# Altium schematic symbol library LATTICEPLDS_Library.SchLib: 291 symbols (part 19 of 32)
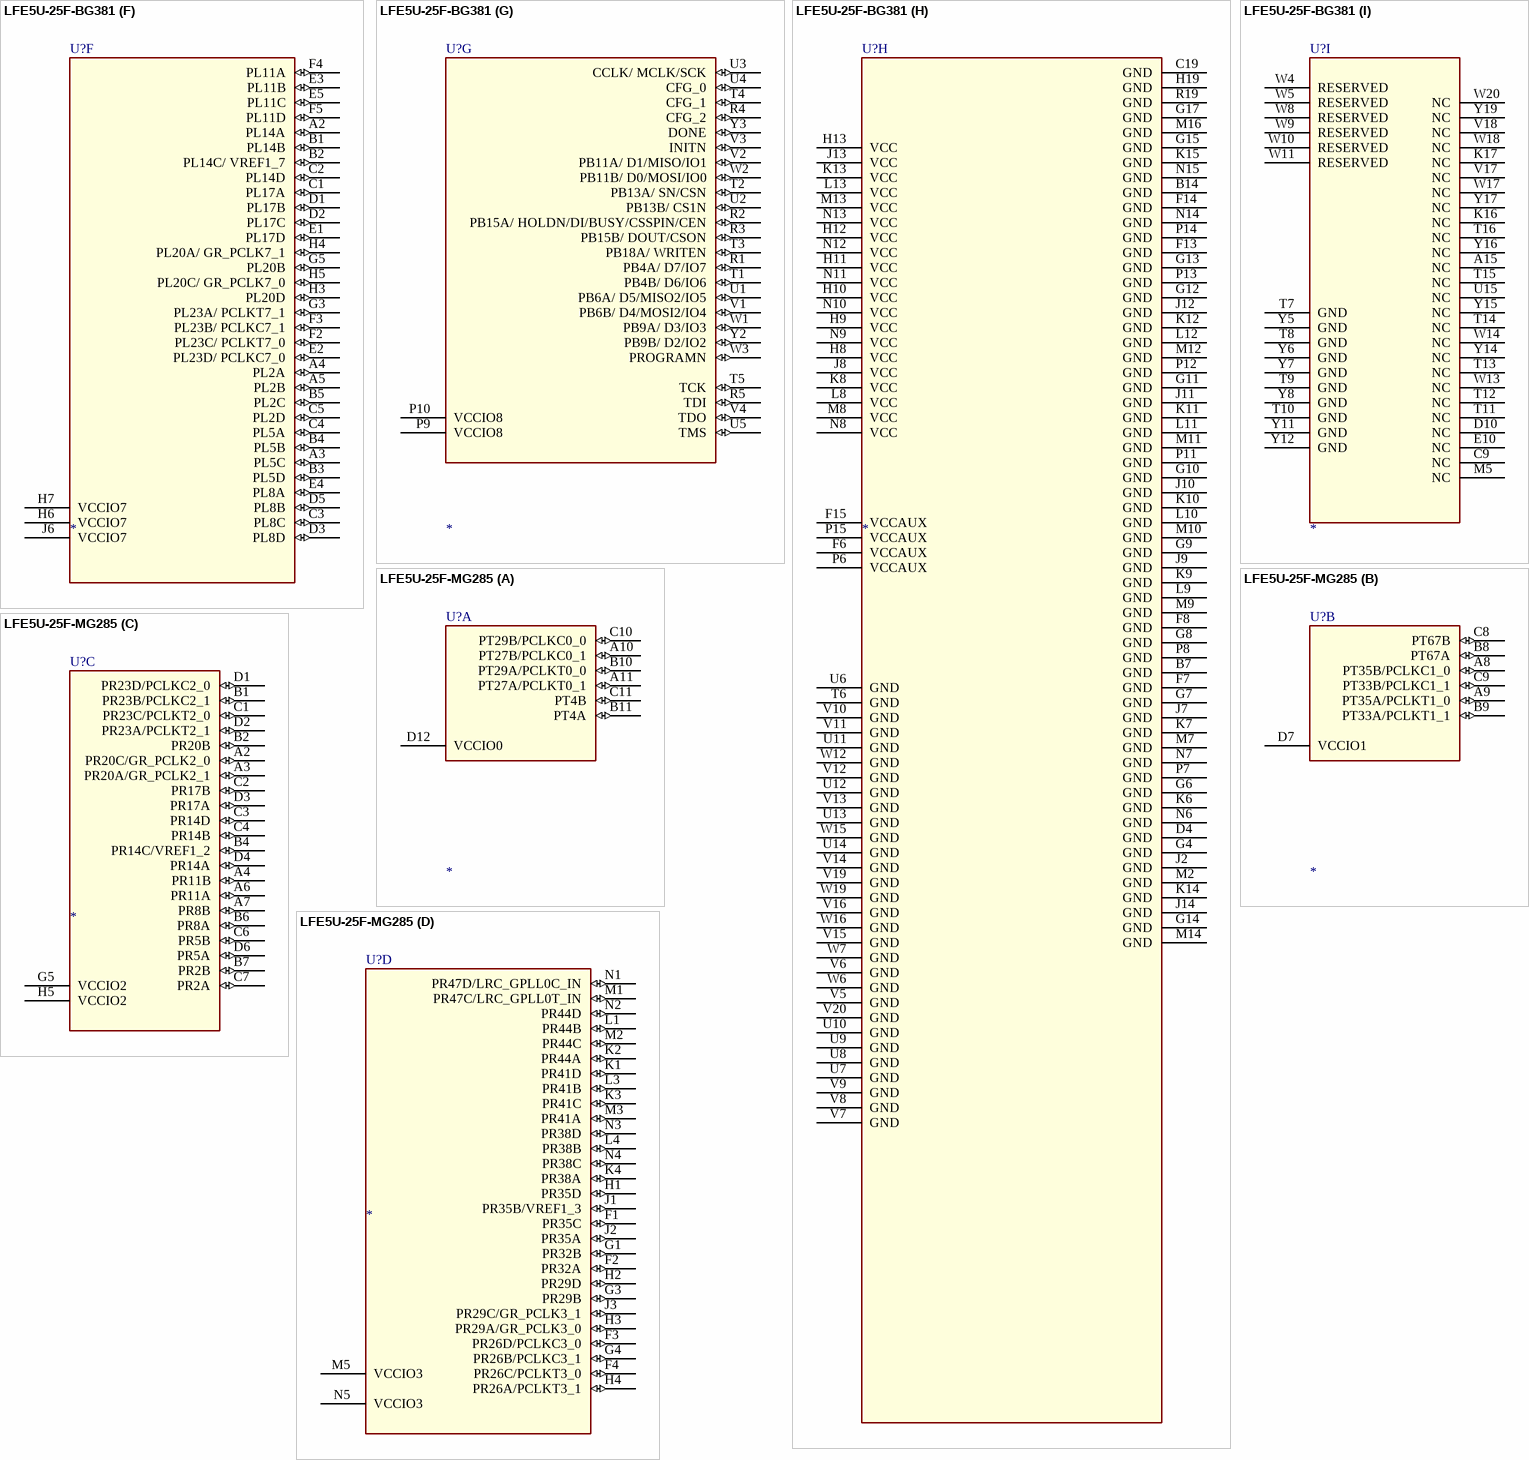
[diagram p321: symbols LFE5U-25F-BG381 to LFE5U-25F-MG285]

## LFE5U-25F-BG381
designator U?
SWAP_INFO: (S1+S2+S3+S4+S5+S6+S7+S8+S9); SPLIT_INST: TRUE
part A pins: A6 PT4A (io), A7 PT18A (io), A8 PT18B (io), A9 PT24A/ GR_PCLK0_1 (io), A10 PT27A/ PCLKT0_1 (io), A11 PT27B/ PCLKC0_1 (io), B6 PT4B (io), B8 PT15B (io), B9 PT22A (io), B10 PT24B/ GR_PCLK0_0 (io), B11 PT29A/ PCLKT0_0 (io), C6 PT11A (io), C7 PT11B (io), C8 PT15A (io), C10 PT22B (io), C11 PT29B/ PCLKC0_0 (io), D6 PT6B (io), D7 PT9B (io), D8 PT13B (io), D9 PT20A (io), E6 PT6A (io), E7 PT9A (io), E8 PT13A (io), E9 PT20B (io), F9 VCCIO0 (power), F10 VCCIO0 (power)
part B pins: A12 PT40A (io), A13 PT40B (io), A14 PT47A (io), A16 PT56A (io), A17 PT62A (io), A18 PT65A (io), A19 PT67A (io), B12 PT35A/ PCLKT1_0 (io), B13 PT42A (io), B15 PT51A (io), B16 PT56B (io), B17 PT60A (io), B18 PT62B (io), B19 PT65B (io), B20 PT67B (io), C12 PT35B/ PCLKC1_0 (io), C13 PT42B (io), C14 PT47B (io), C15 PT51B (io), C16 PT58A (io), C17 PT60B (io), D11 PT33A/ PCLKT1_1 (io), D12 PT38A/ GR_PCLK1_0 (io), D13 PT44A (io), D14 PT49A (io), D15 PT53A (io), D16 PT58B (io), E11 PT33B/ PCLKC1_1 (io), E12 PT38B/ GR_PCLK1_1 (io), E13 PT44B (io), E14 PT49B (io), E15 PT53B (io), F11 VCCIO1 (power), F12 VCCIO1 (power)
part C pins: C18 PR2A (io), C20 PR14A (io), D17 PR2B (io), D18 PR5A (io), D19 PR14B (io), D20 PR14C/ VREF1_2 (io), E16 PR2C (io), E17 PR5B (io), E18 PR5C (io), E19 PR14D (io), E20 PR17A (io), F16 PR2D (io), F17 PR8A (io), F18 PR5D (io), F19 PR17B (io), F20 PR17C (io), G16 PR8C (io), G18 PR8B (io), G19 PR20A/ GR_PCLK2_1 (io), G20 PR17D (io), H14 VCCIO2 (power), H15 VCCIO2 (power), H16 PR8D (io), H17 PR11B (io), H18 PR11A (io), H20 PR20B (io), J15 VCCIO2 (power), J16 PR11D (io), J17 PR11C (io), J18 PR20C/ GR_PCLK2_0 (io), J19 PR23A/ PCLKT2_1 (io), J20 PR23C/ PCLKT2_0 (io), K18 PR20D (io), K19 PR23B/ PCLKC2_1 (io), K20 PR23D/ PCLKC2_0 (io)
part D pins: L14 VCCIO3 (power), L15 VCCIO3 (power), L16 PR29A/ GR_PCLK3_0 (io), L17 PR29B (io), L18 PR29C/ GR_PCLK3_1 (io), L19 PR26C/ PCLKT3_0 (io), L20 PR26A/ PCLKT3_1 (io), M15 VCCIO3 (power), M17 PR32B (io), M18 PR29D (io), M19 PR26D/ PCLKC3_0 (io), M20 PR26B/ PCLKC3_1 (io), N16 PR32A (io), N17 PR35A (io), N18 PR32C (io), N19 PR38A (io), N20 PR38B (io), P16 PR35B/ VREF1_3 (io), P17 PR32D (io), P18 PR38D (io), P19 PR38C (io), P20 PR41A (io), R16 PR35C (io), R17 PR35D (io), R18 PR44B (io), R20 PR41B (io), T17 PR47D/ LRC_GPLL0C_IN (io), T18 PR44D (io), T19 PR44A (io), T20 PR41C (io), U16 PR47C/ LRC_GPLL0T_IN (io), U17 PR47B (io), U18 PR47A (io), U19 PR44C (io), U20 PR41D (io)
part E pins: F1 PL26B/ PCLKC6_1 (io), G1 PL26D/ PCLKC6_0 (io), G2 PL26A/ PCLKT6_1 (io), H1 PL32C (io), H2 PL26C/ PCLKT6_0 (io), J1 PL32B (io), J3 PL29C/ GR_PCLK6_1 (io), J4 PL29A/ GR_PCLK6_0 (io), J5 PL29B (io), K1 PL32D (io), K2 PL32A (io), K3 PL29D (io), K4 PL35A (io), K5 PL35B/ VREF1_6 (io), L1 PL44C (io), L2 PL41D (io), L3 PL41C (io), L4 PL35C (io), L5 PL35D (io), L6 VCCIO6 (power), L7 VCCIO6 (power), M1 PL44B (io), M3 PL41B (io), M4 PL38A (io), M6 VCCIO6 (power), N1 PL44D (io), N2 PL44A (io), N3 PL41A (io), N4 PL38C (io), N5 PL38B (io), P1 PL47A (io), P2 PL47B (io), P3 PL47C/ LLC_GPLL0T_IN (io), P4 PL47D/ LLC_GPLL0C_IN (io), P5 PL38D (io)
part F pins: A2 PL14A (io), A3 PL5C (io), A4 PL2A (io), A5 PL2B (io), B1 PL14B (io), B2 PL14C/ VREF1_7 (io), B3 PL5D (io), B4 PL5B (io), B5 PL2C (io), C1 PL17A (io), C2 PL14D (io), C3 PL8C (io), C4 PL5A (io), C5 PL2D (io), D1 PL17B (io), D2 PL17C (io), D3 PL8D (io), D5 PL8B (io), E1 PL17D (io), E2 PL23D/ PCLKC7_0 (io), E3 PL11B (io), E4 PL8A (io), E5 PL11C (io), F2 PL23C/ PCLKT7_0 (io), F3 PL23B/ PCLKC7_1 (io), F4 PL11A (io), F5 PL11D (io), G3 PL23A/ PCLKT7_1 (io), G5 PL20B (io), H3 PL20D (io), H4 PL20A/ GR_PCLK7_1 (io), H5 PL20C/ GR_PCLK7_0 (io), H6 VCCIO7 (power), H7 VCCIO7 (power), J6 VCCIO7 (power)
part G pins: P9 VCCIO8 (power), P10 VCCIO8 (power), R1 PB4A/ D7/IO7 (io), R2 PB15A/ HOLDN/DI/BUSY/CSSPIN/CEN (io), R3 PB15B/ DOUT/CSON (io), R4 CFG_2 (io), R5 TDI (io), T1 PB4B/ D6/IO6 (io), T2 PB13A/ SN/CSN (io), T3 PB18A/ WRITEN (io), T4 CFG_1 (io), T5 TCK (io), U1 PB6A/ D5/MISO2/IO5 (io), U2 PB13B/ CS1N (io), U3 CCLK/ MCLK/SCK (io), U4 CFG_0 (io), U5 TMS (io), V1 PB6B/ D4/MOSI2/IO4 (io), V2 PB11A/ D1/MISO/IO1 (io), V3 INITN (io), V4 TDO (io), W1 PB9A/ D3/IO3 (io), W2 PB11B/ D0/MOSI/IO0 (io), W3 PROGRAMN (io), Y2 PB9B/ D2/IO2 (io), Y3 DONE (io)
part H pins: B7 GND (power), B14 GND (power), C19 GND (power), D4 GND (power), F6 VCCAUX (power), F7 GND (power), F8 GND (power), F13 GND (power), F14 GND (power), F15 VCCAUX (power), G4 GND (power), G6 GND (power), G7 GND (power), G8 GND (power), G9 GND (power), G10 GND (power), G11 GND (power), G12 GND (power), G13 GND (power), G14 GND (power), G15 GND (power), G17 GND (power), H8 VCC (power), H9 VCC (power), H10 VCC (power), H11 VCC (power), H12 VCC (power), H13 VCC (power), H19 GND (power), J2 GND (power), J7 GND (power), J8 VCC (power), J9 GND (power), J10 GND (power), J11 GND (power), J12 GND (power), J13 VCC (power), J14 GND (power), K6 GND (power), K7 GND (power), K8 VCC (power), K9 GND (power), K10 GND (power), K11 GND (power), K12 GND (power), K13 VCC (power), K14 GND (power), K15 GND (power), L8 VCC (power), L9 GND (power), L10 GND (power), L11 GND (power), L12 GND (power), L13 VCC (power), M2 GND (power), M7 GND (power), M8 VCC (power), M9 GND (power), M10 GND (power), M11 GND (power), M12 GND (power), M13 VCC (power), M14 GND (power), M16 GND (power), N6 GND (power), N7 GND (power), N8 VCC (power), N9 VCC (power), N10 VCC (power), N11 VCC (power), N12 VCC (power), N13 VCC (power), N14 GND (power), N15 GND (power), P6 VCCAUX (power), P7 GND (power), P8 GND (power), P11 GND (power), P12 GND (power), P13 GND (power), P14 GND (power), P15 VCCAUX (power), R19 GND (power), T6 GND (power), U6 GND (power), U7 GND (power), U8 GND (power), U9 GND (power), U10 GND (power), U11 GND (power), U12 GND (power), U13 GND (power), U14 GND (power), V5 GND (power), V6 GND (power), V7 GND (power), V8 GND (power), V9 GND (power), V10 GND (power), V11 GND (power), V12 GND (power), V13 GND (power), V14 GND (power), V15 GND (power), V16 GND (power), V19 GND (power), V20 GND (power), W6 GND (power), W7 GND (power), W12 GND (power), W15 GND (power), W16 GND (power), W19 GND (power)
part I pins: A15 NC (power), C9 NC (power), D10 NC (power), E10 NC (power), K16 NC (power), K17 NC (power), M5 NC (power), T7 GND (power), T8 GND (power), T9 GND (power), T10 GND (power), T11 NC (power), T12 NC (power), T13 NC (power), T14 NC (power), T15 NC (power), T16 NC (power), U15 NC (power), V17 NC (power), V18 NC (power), W4 RESERVED (power), W5 RESERVED (power), W8 RESERVED (power), W9 RESERVED (power), W10 RESERVED (power), W11 RESERVED (power), W13 NC (power), W14 NC (power), W17 NC (power), W18 NC (power), W20 NC (power), Y5 GND (power), Y6 GND (power), Y7 GND (power), Y8 GND (power), Y11 GND (power), Y12 GND (power), Y14 NC (power), Y15 NC (power), Y16 NC (power), Y17 NC (power), Y19 NC (power)

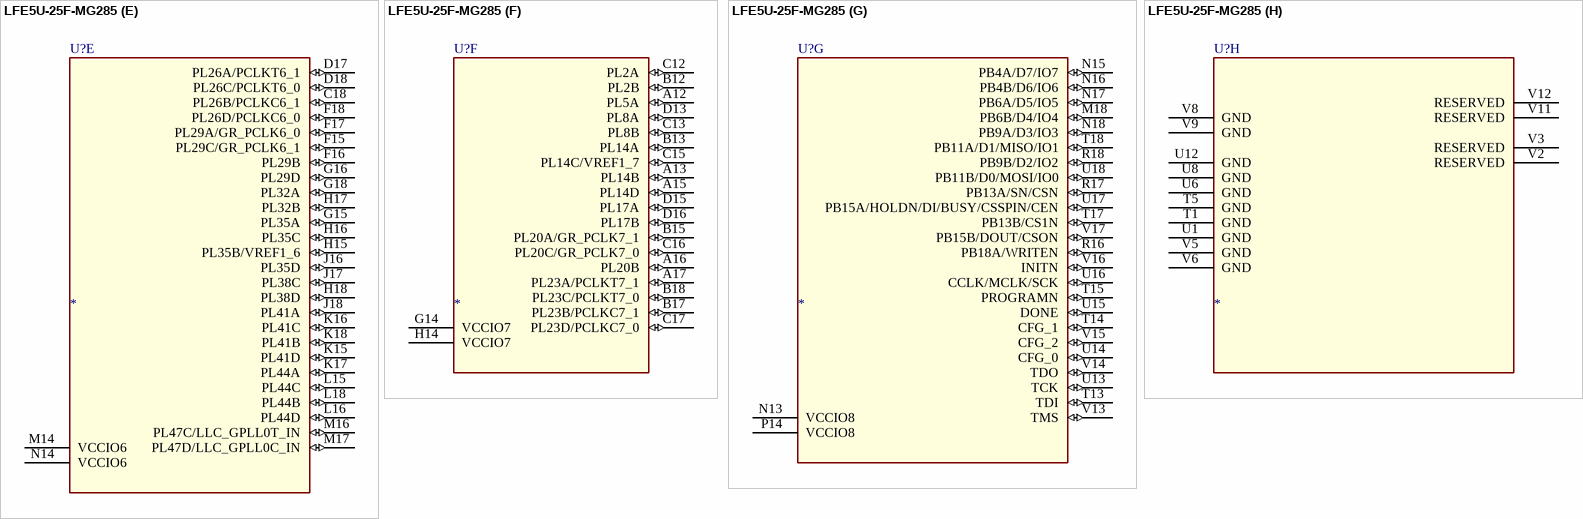
[diagram p175: symbol LFE5U-25F-MG285]

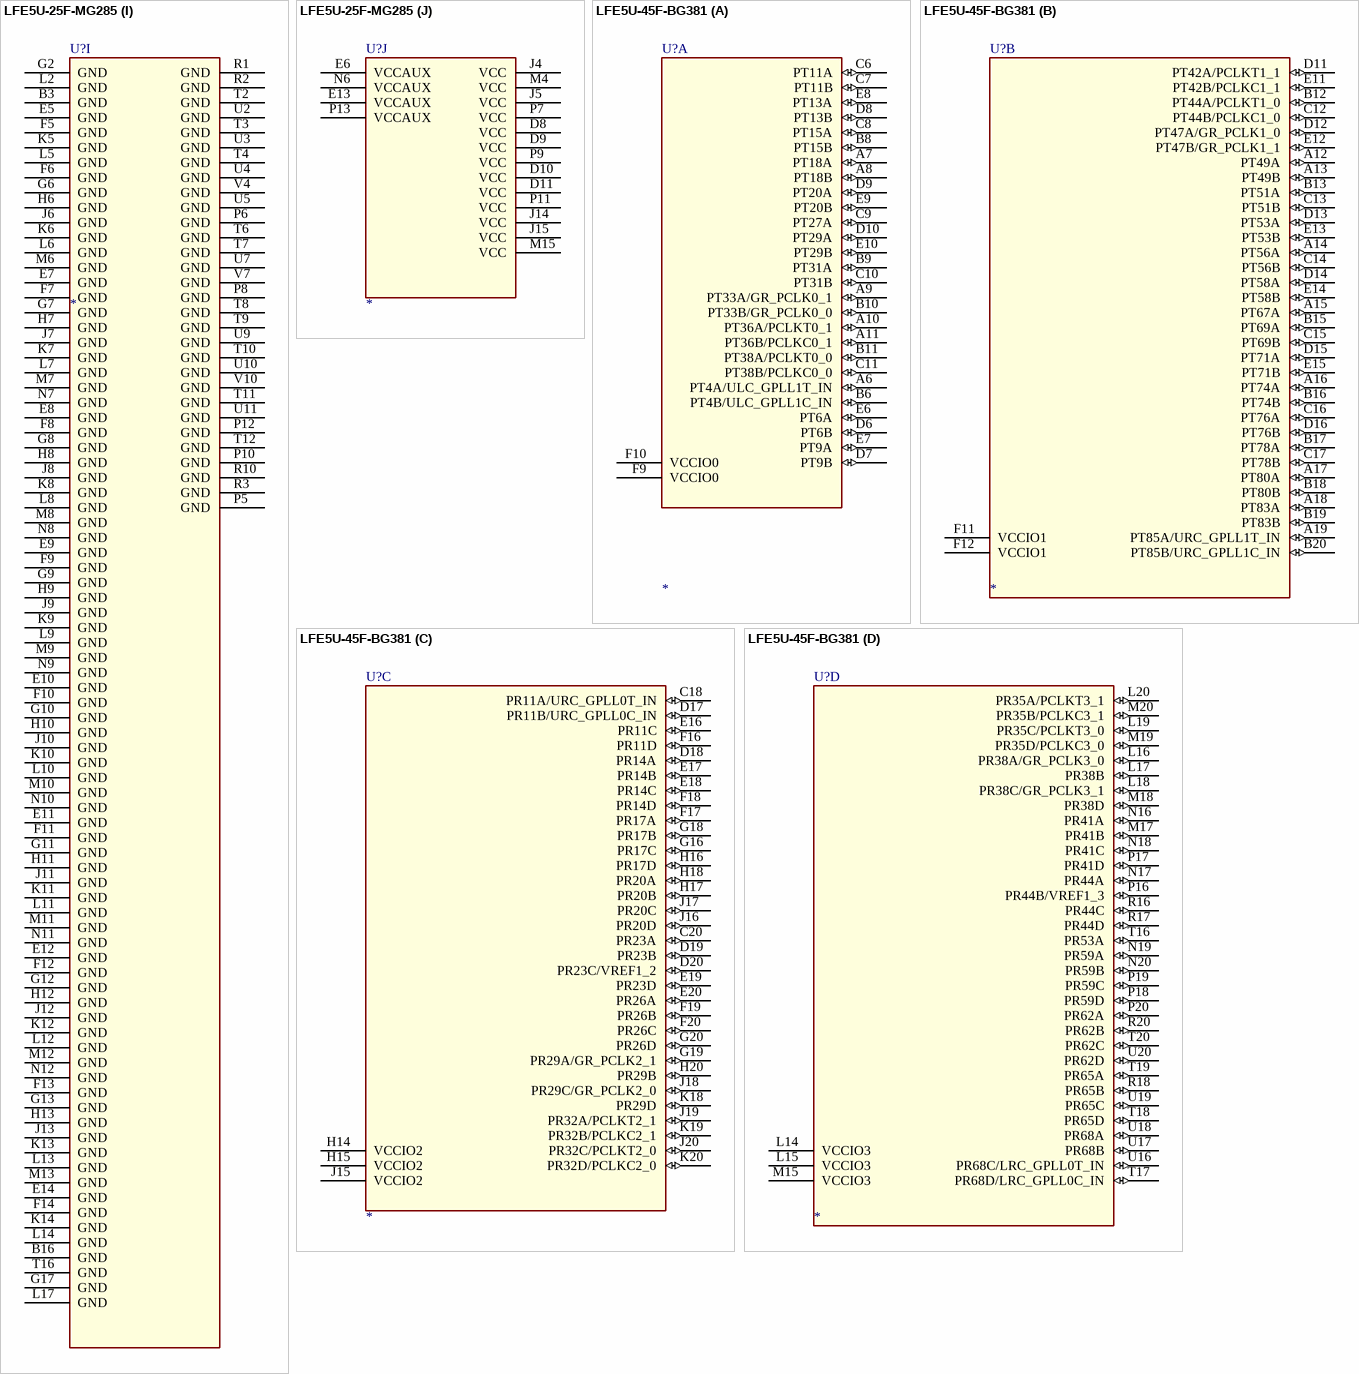
[diagram p176: symbols LFE5U-25F-MG285 to LFE5U-45F-BG381]

## LFE5U-25F-MG285
designator U?
SWAP_INFO: (S1+S2+S3+S4+S5+S6+S7+S8+S9+S10); SPLIT_INST: TRUE
part A pins: A10 PT27B/PCLKC0_1 (io), A11 PT27A/PCLKT0_1 (io), B10 PT29A/PCLKT0_0 (io), B11 PT4A (io), C10 PT29B/PCLKC0_0 (io), C11 PT4B (io), D12 VCCIO0 (power)
part B pins: A8 PT35B/PCLKC1_0 (io), A9 PT35A/PCLKT1_0 (io), B8 PT67A (io), B9 PT33A/PCLKT1_1 (io), C8 PT67B (io), C9 PT33B/PCLKC1_1 (io), D7 VCCIO1 (power)
part C pins: A2 PR20C/GR_PCLK2_0 (io), A3 PR20A/GR_PCLK2_1 (io), A4 PR11B (io), A6 PR11A (io), A7 PR8B (io), B1 PR23B/PCLKC2_1 (io), B2 PR20B (io), B4 PR14C/VREF1_2 (io), B6 PR8A (io), B7 PR2B (io), C1 PR23C/PCLKT2_0 (io), C2 PR17B (io), C3 PR14D (io), C4 PR14B (io), C6 PR5B (io), C7 PR2A (io), D1 PR23D/PCLKC2_0 (io), D2 PR23A/PCLKT2_1 (io), D3 PR17A (io), D4 PR14A (io), D6 PR5A (io), G5 VCCIO2 (power), H5 VCCIO2 (power)
part D pins: F1 PR35C (io), F2 PR32A (io), F3 PR26D/PCLKC3_0 (io), F4 PR26C/PCLKT3_0 (io), G1 PR32B (io), G3 PR29B (io), G4 PR26B/PCLKC3_1 (io), H1 PR35D (io), H2 PR29D (io), H3 PR29A/GR_PCLK3_0 (io), H4 PR26A/PCLKT3_1 (io), J1 PR35B/VREF1_3 (io), J2 PR35A (io), J3 PR29C/GR_PCLK3_1 (io), K1 PR41D (io), K2 PR44A (io), K3 PR41C (io), K4 PR38A (io), L1 PR44B (io), L3 PR41B (io), L4 PR38B (io), M1 PR47C/LRC_GPLL0T_IN (io), M2 PR44C (io), M3 PR41A (io), M5 VCCIO3 (power), N1 PR47D/LRC_GPLL0C_IN (io), N2 PR44D (io), N3 PR38D (io), N4 PR38C (io), N5 VCCIO3 (power)
part E pins: C18 PL26B/PCLKC6_1 (io), D17 PL26A/PCLKT6_1 (io), D18 PL26C/PCLKT6_0 (io), F15 PL29C/GR_PCLK6_1 (io), F16 PL29B (io), F17 PL29A/GR_PCLK6_0 (io), F18 PL26D/PCLKC6_0 (io), G15 PL35A (io), G16 PL29D (io), G18 PL32A (io), H15 PL35B/VREF1_6 (io), H16 PL35C (io), H17 PL32B (io), H18 PL38D (io), J16 PL35D (io), J17 PL38C (io), J18 PL41A (io), K15 PL41D (io), K16 PL41C (io), K17 PL44A (io), K18 PL41B (io), L15 PL44C (io), L16 PL44D (io), L18 PL44B (io), M14 VCCIO6 (power), M16 PL47C/LLC_GPLL0T_IN (io), M17 PL47D/LLC_GPLL0C_IN (io), N14 VCCIO6 (power)
part F pins: A12 PL5A (io), A13 PL14B (io), A15 PL14D (io), A16 PL20B (io), A17 PL23A/PCLKT7_1 (io), B12 PL2B (io), B13 PL14A (io), B15 PL20A/GR_PCLK7_1 (io), B17 PL23B/PCLKC7_1 (io), B18 PL23C/PCLKT7_0 (io), C12 PL2A (io), C13 PL8B (io), C15 PL14C/VREF1_7 (io), C16 PL20C/GR_PCLK7_0 (io), C17 PL23D/PCLKC7_0 (io), D13 PL8A (io), D15 PL17A (io), D16 PL17B (io), G14 VCCIO7 (power), H14 VCCIO7 (power)
part G pins: M18 PB6B/D4/IO4 (io), N13 VCCIO8 (power), N15 PB4A/D7/IO7 (io), N16 PB4B/D6/IO6 (io), N17 PB6A/D5/IO5 (io), N18 PB9A/D3/IO3 (io), P14 VCCIO8 (power), R16 PB18A/WRITEN (io), R17 PB13A/SN/CSN (io), R18 PB9B/D2/IO2 (io), T13 TDI (io), T14 CFG_1 (io), T15 PROGRAMN (io), T17 PB13B/CS1N (io), T18 PB11A/D1/MISO/IO1 (io), U13 TCK (io), U14 CFG_0 (io), U15 DONE (io), U16 CCLK/MCLK/SCK (io), U17 PB15A/HOLDN/DI/BUSY/CSSPIN/CEN (io), U18 PB11B/D0/MOSI/IO0 (io), V13 TMS (io), V14 TDO (io), V15 CFG_2 (io), V16 INITN (io), V17 PB15B/DOUT/CSON (io)
part H pins: T1 GND (power), T5 GND (power), U1 GND (power), U6 GND (power), U8 GND (power), U12 GND (power), V2 RESERVED (power), V3 RESERVED (power), V5 GND (power), V6 GND (power), V8 GND (power), V9 GND (power), V11 RESERVED (power), V12 RESERVED (power)
part I pins: B3 GND (power), B16 GND (power), E5 GND (power), E7 GND (power), E8 GND (power), E9 GND (power), E10 GND (power), E11 GND (power), E12 GND (power), E14 GND (power), F5 GND (power), F6 GND (power), F7 GND (power), F8 GND (power), F9 GND (power), F10 GND (power), F11 GND (power), F12 GND (power), F13 GND (power), F14 GND (power), G2 GND (power), G6 GND (power), G7 GND (power), G8 GND (power), G9 GND (power), G10 GND (power), G11 GND (power), G12 GND (power), G13 GND (power), G17 GND (power), H6 GND (power), H7 GND (power), H8 GND (power), H9 GND (power), H10 GND (power), H11 GND (power), H12 GND (power), H13 GND (power), J6 GND (power), J7 GND (power), J8 GND (power), J9 GND (power), J10 GND (power), J11 GND (power), J12 GND (power), J13 GND (power), K5 GND (power), K6 GND (power), K7 GND (power), K8 GND (power), K9 GND (power), K10 GND (power), K11 GND (power), K12 GND (power), K13 GND (power), K14 GND (power), L2 GND (power), L5 GND (power), L6 GND (power), L7 GND (power), L8 GND (power), L9 GND (power), L10 GND (power), L11 GND (power), L12 GND (power), L13 GND (power), L14 GND (power), L17 GND (power), M6 GND (power), M7 GND (power), M8 GND (power), M9 GND (power), M10 GND (power), M11 GND (power), M12 GND (power), M13 GND (power), N7 GND (power), N8 GND (power), N9 GND (power), N10 GND (power), N11 GND (power), N12 GND (power), P5 GND (power), P6 GND (power), P8 GND (power), P10 GND (power), P12 GND (power), R1 GND (power), R2 GND (power), R3 GND (power), R10 GND (power), T2 GND (power), T3 GND (power), T4 GND (power), T6 GND (power), T7 GND (power), T8 GND (power), T9 GND (power), T10 GND (power), T11 GND (power), T12 GND (power), T16 GND (power), U2 GND (power), U3 GND (power), U4 GND (power), U5 GND (power), U7 GND (power), U9 GND (power), U10 GND (power), U11 GND (power), V4 GND (power), V7 GND (power), V10 GND (power)
part J pins: D8 VCC (power), D9 VCC (power), D10 VCC (power), D11 VCC (power), E6 VCCAUX (power), E13 VCCAUX (power), J4 VCC (power), J5 VCC (power), J14 VCC (power), J15 VCC (power), M4 VCC (power), M15 VCC (power), N6 VCCAUX (power), P7 VCC (power), P9 VCC (power), P11 VCC (power), P13 VCCAUX (power)

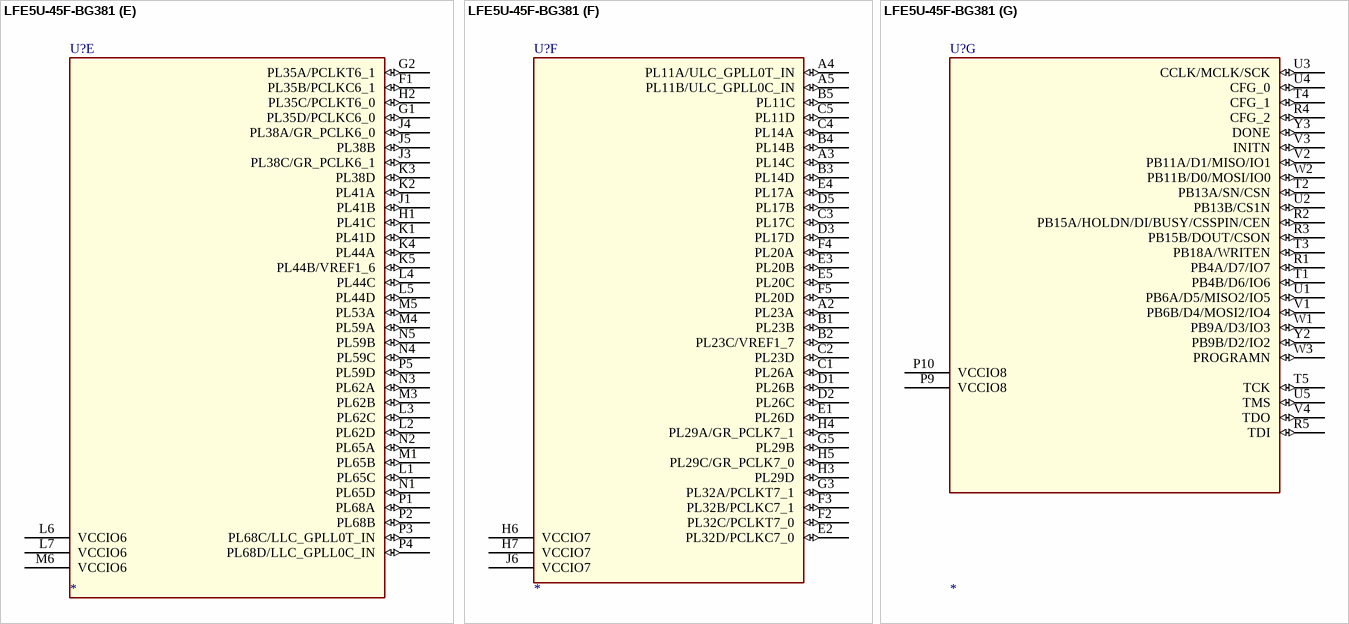
[diagram p177: symbol LFE5U-45F-BG381]

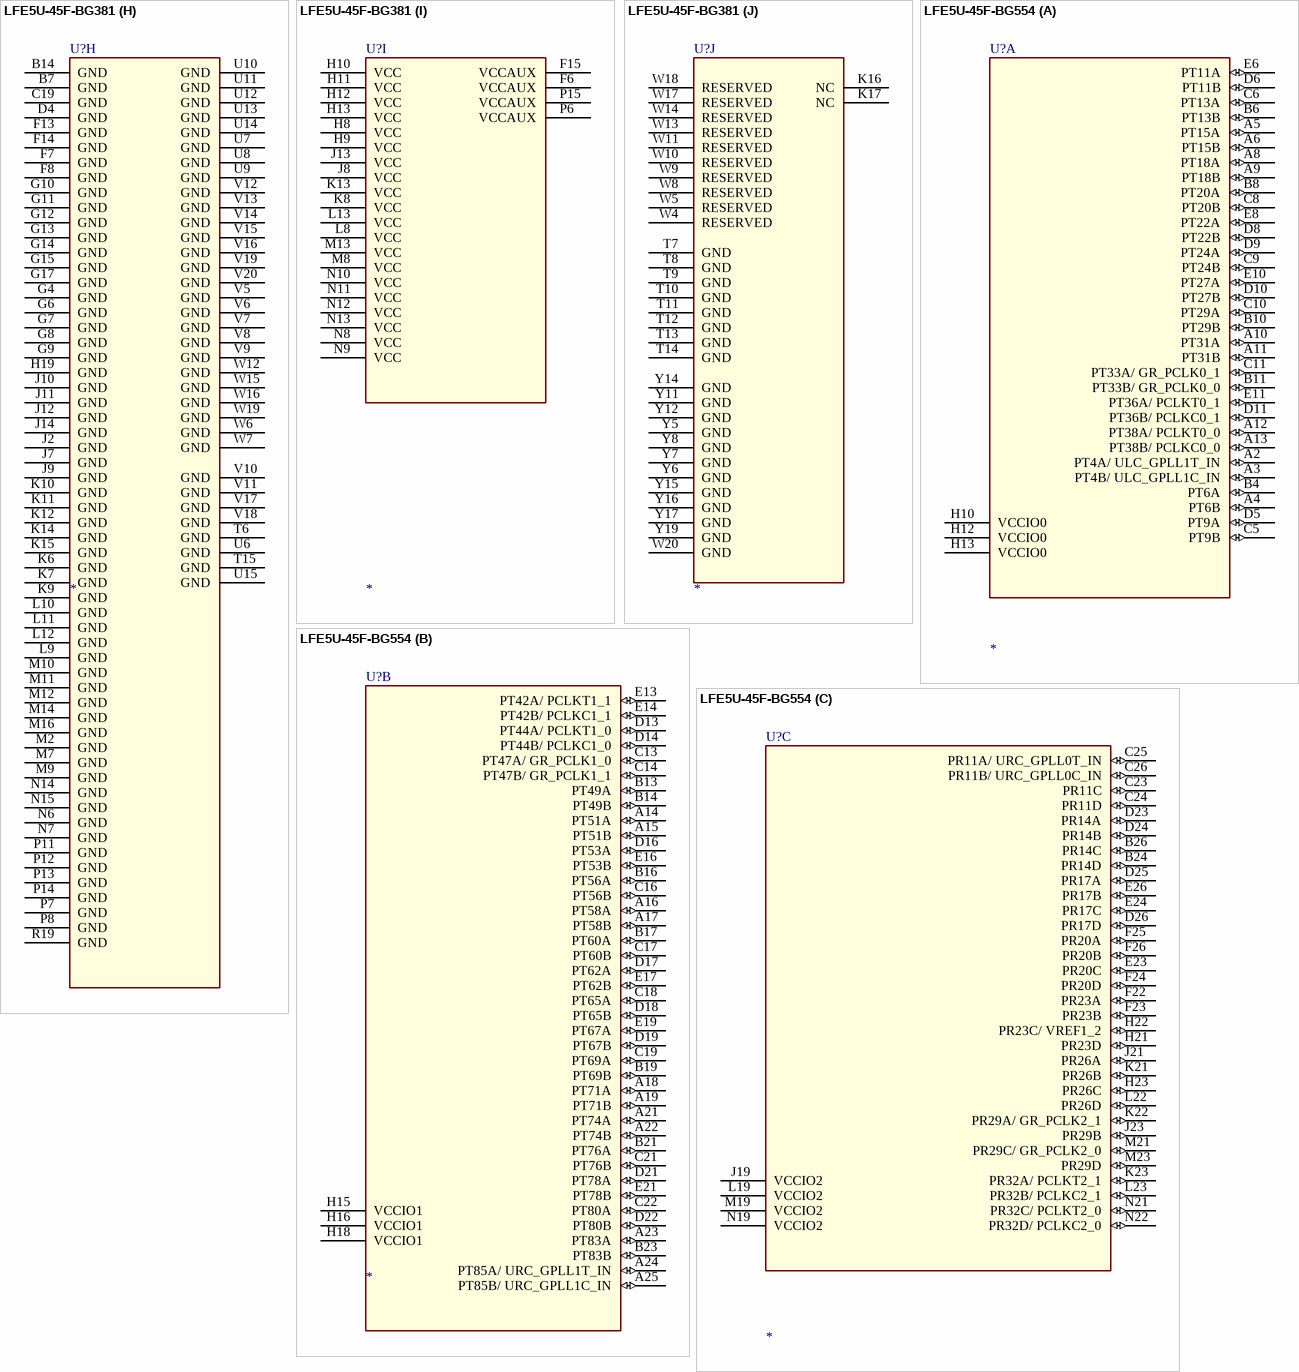
[diagram p178: symbols LFE5U-45F-BG381 to LFE5U-45F-BG554]

## LFE5U-45F-BG381
designator U?
SWAP_INFO: (S1+S2+S3+S4+S5+S6+S7+S8+S9+S10); SPLIT_INST: TRUE
part A pins: A6 PT4A/ULC_GPLL1T_IN (io), A7 PT18A (io), A8 PT18B (io), A9 PT33A/GR_PCLK0_1 (io), A10 PT36A/PCLKT0_1 (io), A11 PT36B/PCLKC0_1 (io), B6 PT4B/ULC_GPLL1C_IN (io), B8 PT15B (io), B9 PT31A (io), B10 PT33B/GR_PCLK0_0 (io), B11 PT38A/PCLKT0_0 (io), C6 PT11A (io), C7 PT11B (io), C8 PT15A (io), C9 PT27A (io), C10 PT31B (io), C11 PT38B/PCLKC0_0 (io), D6 PT6B (io), D7 PT9B (io), D8 PT13B (io), D9 PT20A (io), D10 PT29A (io), E6 PT6A (io), E7 PT9A (io), E8 PT13A (io), E9 PT20B (io), E10 PT29B (io), F9 VCCIO0 (power), F10 VCCIO0 (power)
part B pins: A12 PT49A (io), A13 PT49B (io), A14 PT56A (io), A15 PT67A (io), A16 PT74A (io), A17 PT80A (io), A18 PT83A (io), A19 PT85A/URC_GPLL1T_IN (io), B12 PT44A/PCLKT1_0 (io), B13 PT51A (io), B15 PT69A (io), B16 PT74B (io), B17 PT78A (io), B18 PT80B (io), B19 PT83B (io), B20 PT85B/URC_GPLL1C_IN (io), C12 PT44B/PCLKC1_0 (io), C13 PT51B (io), C14 PT56B (io), C15 PT69B (io), C16 PT76A (io), C17 PT78B (io), D11 PT42A/PCLKT1_1 (io), D12 PT47A/GR_PCLK1_0 (io), D13 PT53A (io), D14 PT58A (io), D15 PT71A (io), D16 PT76B (io), E11 PT42B/PCLKC1_1 (io), E12 PT47B/GR_PCLK1_1 (io), E13 PT53B (io), E14 PT58B (io), E15 PT71B (io), F11 VCCIO1 (power), F12 VCCIO1 (power)
part C pins: C18 PR11A/URC_GPLL0T_IN (io), C20 PR23A (io), D17 PR11B/URC_GPLL0C_IN (io), D18 PR14A (io), D19 PR23B (io), D20 PR23C/VREF1_2 (io), E16 PR11C (io), E17 PR14B (io), E18 PR14C (io), E19 PR23D (io), E20 PR26A (io), F16 PR11D (io), F17 PR17A (io), F18 PR14D (io), F19 PR26B (io), F20 PR26C (io), G16 PR17C (io), G18 PR17B (io), G19 PR29A/GR_PCLK2_1 (io), G20 PR26D (io), H14 VCCIO2 (power), H15 VCCIO2 (power), H16 PR17D (io), H17 PR20B (io), H18 PR20A (io), H20 PR29B (io), J15 VCCIO2 (power), J16 PR20D (io), J17 PR20C (io), J18 PR29C/GR_PCLK2_0 (io), J19 PR32A/PCLKT2_1 (io), J20 PR32C/PCLKT2_0 (io), K18 PR29D (io), K19 PR32B/PCLKC2_1 (io), K20 PR32D/PCLKC2_0 (io)
part D pins: L14 VCCIO3 (power), L15 VCCIO3 (power), L16 PR38A/GR_PCLK3_0 (io), L17 PR38B (io), L18 PR38C/GR_PCLK3_1 (io), L19 PR35C/PCLKT3_0 (io), L20 PR35A/PCLKT3_1 (io), M15 VCCIO3 (power), M17 PR41B (io), M18 PR38D (io), M19 PR35D/PCLKC3_0 (io), M20 PR35B/PCLKC3_1 (io), N16 PR41A (io), N17 PR44A (io), N18 PR41C (io), N19 PR59A (io), N20 PR59B (io), P16 PR44B/VREF1_3 (io), P17 PR41D (io), P18 PR59D (io), P19 PR59C (io), P20 PR62A (io), R16 PR44C (io), R17 PR44D (io), R18 PR65B (io), R20 PR62B (io), T16 PR53A (io), T17 PR68D/LRC_GPLL0C_IN (io), T18 PR65D (io), T19 PR65A (io), T20 PR62C (io), U16 PR68C/LRC_GPLL0T_IN (io), U17 PR68B (io), U18 PR68A (io), U19 PR65C (io), U20 PR62D (io)
part E pins: F1 PL35B/PCLKC6_1 (io), G1 PL35D/PCLKC6_0 (io), G2 PL35A/PCLKT6_1 (io), H1 PL41C (io), H2 PL35C/PCLKT6_0 (io), J1 PL41B (io), J3 PL38C/GR_PCLK6_1 (io), J4 PL38A/GR_PCLK6_0 (io), J5 PL38B (io), K1 PL41D (io), K2 PL41A (io), K3 PL38D (io), K4 PL44A (io), K5 PL44B/VREF1_6 (io), L1 PL65C (io), L2 PL62D (io), L3 PL62C (io), L4 PL44C (io), L5 PL44D (io), L6 VCCIO6 (power), L7 VCCIO6 (power), M1 PL65B (io), M3 PL62B (io), M4 PL59A (io), M5 PL53A (io), M6 VCCIO6 (power), N1 PL65D (io), N2 PL65A (io), N3 PL62A (io), N4 PL59C (io), N5 PL59B (io), P1 PL68A (io), P2 PL68B (io), P3 PL68C/LLC_GPLL0T_IN (io), P4 PL68D/LLC_GPLL0C_IN (io), P5 PL59D (io)
part F pins: A2 PL23A (io), A3 PL14C (io), A4 PL11A/ULC_GPLL0T_IN (io), A5 PL11B/ULC_GPLL0C_IN (io), B1 PL23B (io), B2 PL23C/VREF1_7 (io), B3 PL14D (io), B4 PL14B (io), B5 PL11C (io), C1 PL26A (io), C2 PL23D (io), C3 PL17C (io), C4 PL14A (io), C5 PL11D (io), D1 PL26B (io), D2 PL26C (io), D3 PL17D (io), D5 PL17B (io), E1 PL26D (io), E2 PL32D/PCLKC7_0 (io), E3 PL20B (io), E4 PL17A (io), E5 PL20C (io), F2 PL32C/PCLKT7_0 (io), F3 PL32B/PCLKC7_1 (io), F4 PL20A (io), F5 PL20D (io), G3 PL32A/PCLKT7_1 (io), G5 PL29B (io), H3 PL29D (io), H4 PL29A/GR_PCLK7_1 (io), H5 PL29C/GR_PCLK7_0 (io), H6 VCCIO7 (power), H7 VCCIO7 (power), J6 VCCIO7 (power)
part G pins: P9 VCCIO8 (power), P10 VCCIO8 (power), R1 PB4A/D7/IO7 (io), R2 PB15A/HOLDN/DI/BUSY/CSSPIN/CEN (io), R3 PB15B/DOUT/CSON (io), R4 CFG_2 (io), R5 TDI (io), T1 PB4B/D6/IO6 (io), T2 PB13A/SN/CSN (io), T3 PB18A/WRITEN (io), T4 CFG_1 (io), T5 TCK (io), U1 PB6A/D5/MISO2/IO5 (io), U2 PB13B/CS1N (io), U3 CCLK/MCLK/SCK (io), U4 CFG_0 (io), U5 TMS (io), V1 PB6B/D4/MOSI2/IO4 (io), V2 PB11A/D1/MISO/IO1 (io), V3 INITN (io), V4 TDO (io), W1 PB9A/D3/IO3 (io), W2 PB11B/D0/MOSI/IO0 (io), W3 PROGRAMN (io), Y2 PB9B/D2/IO2 (io), Y3 DONE (io)
part H pins: B7 GND (power), B14 GND (power), C19 GND (power), D4 GND (power), F7 GND (power), F8 GND (power), F13 GND (power), F14 GND (power), G4 GND (power), G6 GND (power), G7 GND (power), G8 GND (power), G9 GND (power), G10 GND (power), G11 GND (power), G12 GND (power), G13 GND (power), G14 GND (power), G15 GND (power), G17 GND (power), H19 GND (power), J2 GND (power), J7 GND (power), J9 GND (power), J10 GND (power), J11 GND (power), J12 GND (power), J14 GND (power), K6 GND (power), K7 GND (power), K9 GND (power), K10 GND (power), K11 GND (power), K12 GND (power), K14 GND (power), K15 GND (power), L9 GND (power), L10 GND (power), L11 GND (power), L12 GND (power), M2 GND (power), M7 GND (power), M9 GND (power), M10 GND (power), M11 GND (power), M12 GND (power), M14 GND (power), M16 GND (power), N6 GND (power), N7 GND (power), N14 GND (power), N15 GND (power), P7 GND (power), P8 GND (power), P11 GND (power), P12 GND (power), P13 GND (power), P14 GND (power), R19 GND (power), T6 GND (power), T15 GND (power), U6 GND (power), U7 GND (power), U8 GND (power), U9 GND (power), U10 GND (power), U11 GND (power), U12 GND (power), U13 GND (power), U14 GND (power), U15 GND (power), V5 GND (power), V6 GND (power), V7 GND (power), V8 GND (power), V9 GND (power), V10 GND (power), V11 GND (power), V12 GND (power), V13 GND (power), V14 GND (power), V15 GND (power), V16 GND (power), V17 GND (power), V18 GND (power), V19 GND (power), V20 GND (power), W6 GND (power), W7 GND (power), W12 GND (power), W15 GND (power), W16 GND (power), W19 GND (power)
part I pins: F6 VCCAUX (power), F15 VCCAUX (power), H8 VCC (power), H9 VCC (power), H10 VCC (power), H11 VCC (power), H12 VCC (power), H13 VCC (power), J8 VCC (power), J13 VCC (power), K8 VCC (power), K13 VCC (power), L8 VCC (power), L13 VCC (power), M8 VCC (power), M13 VCC (power), N8 VCC (power), N9 VCC (power), N10 VCC (power), N11 VCC (power), N12 VCC (power), N13 VCC (power), P6 VCCAUX (power), P15 VCCAUX (power)
part J pins: K16 NC (power), K17 NC (power), T7 GND (power), T8 GND (power), T9 GND (power), T10 GND (power), T11 GND (power), T12 GND (power), T13 GND (power), T14 GND (power), W4 RESERVED (power), W5 RESERVED (power), W8 RESERVED (power), W9 RESERVED (power), W10 RESERVED (power), W11 RESERVED (power), W13 RESERVED (power), W14 RESERVED (power), W17 RESERVED (power), W18 RESERVED (power), W20 GND (power), Y5 GND (power), Y6 GND (power), Y7 GND (power), Y8 GND (power), Y11 GND (power), Y12 GND (power), Y14 GND (power), Y15 GND (power), Y16 GND (power), Y17 GND (power), Y19 GND (power)

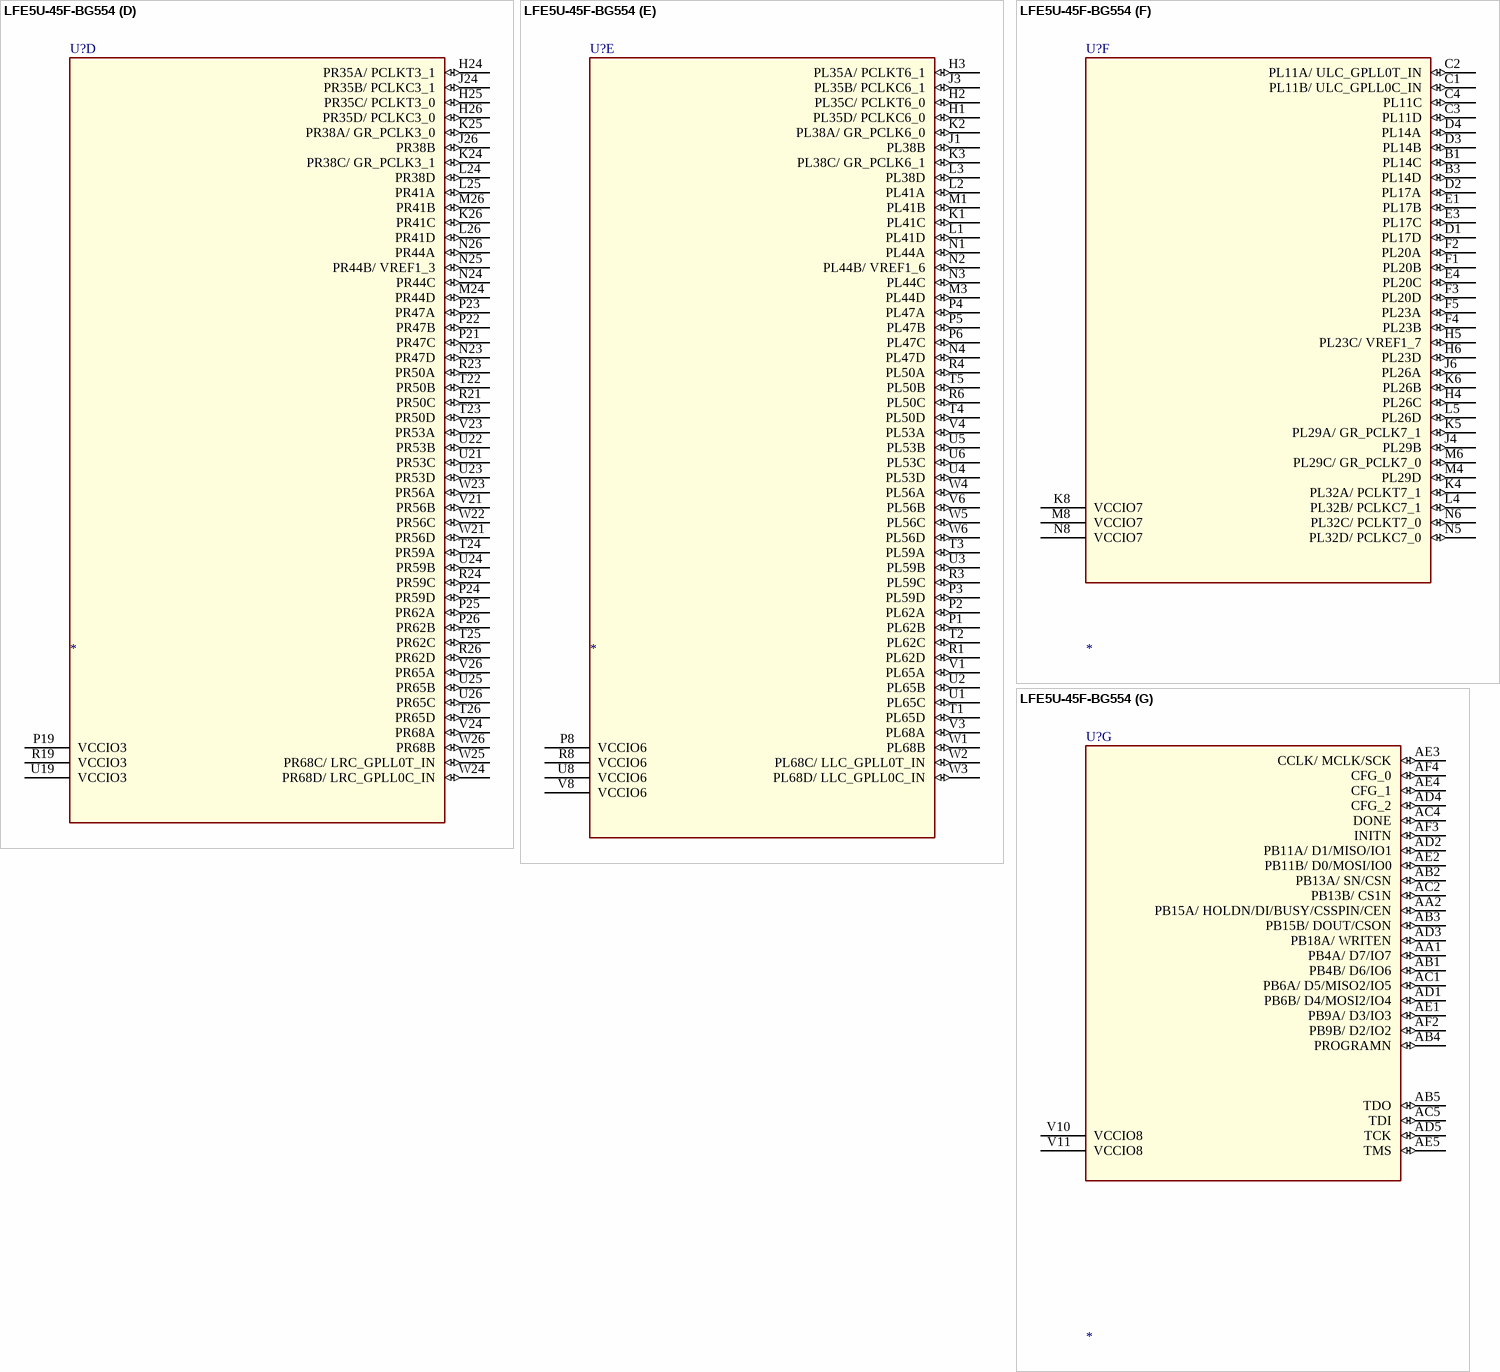
[diagram p179: symbol LFE5U-45F-BG554]
